# Altium schematic symbol library Altium_Lib.SchLib: 403 symbols (part 2 of 4) (continued)
## Inductor__CDRH6D38-6R2NC (continued)
FIXED IND 6.2UH 2.5A 27 MOHM SMD; Manufacturer: Sumida; Core Material: Ferrite; Tolerance: 30%; Shielding: Shielded; DC Resistance (DCR): 27mR; Test Frequency: 100kHz; Supplier 1: Avnet; Manufacturer Part Number: CDRH6D38NP-6R2NC; Stock 1: 0; Pricing 1: 1000=0.3494, 2000=0.349, 4000=0.3484, 6000=0.3477, 8000=0.3475, 10000=0.347, 100000=0.3466 (USD); Mount: Surface Mount; Case/Package: Nonstandard; Weight: 0.021164oz; Min Operating Temperature: -40°C; Max Operating Temperature: 100°C; Packaging: Tape and Reel; Current Rating: 2.5A; Inductance: 6.2uH; Max DC Current: 2.5A; Termination: SMD/SMT; Series: CDRH; Rated Current-Max: 2.5A; Package Quantity: 1000; DC Current: 2.5A; Length: 7mm; Width: 7mm; Height: 4mm; Height - Seated (Max): 0.157inch; Depth: 7mm; Lead Free: Lead Free; Military Standard: Not; RoHS Compliant: Yes; ComponentLink1URL: http://products.sumida.com/products/pdf/CDRH6D38.pdf?src-supplier=Digi-Key; ComponentLink1Description: http://products.sumida.com/products/pdf/CDRH6D38.pdf?src-supplier=Digi-Key; Supplier Part Number 1: CDRH6D38NP-6R2NC
footprint Inductor__6.7mmX6.7mm (6.7x6.7mm)
pins: 1, 2

## Inductor__LQG18HH33NJ00D
designator L?, comment LQG18HH33NJ00D  Inductance: 33nH
FIXED IND 33NH 300MA 600 MOHM; Manufacturer: Murata; Tolerance: 5%; DC Resistance (DCR): 600mR; Self Resonant Frequency: 1.2GHz; Q Factor: 12; Test Frequency: 100MHz; Supplier 1: Digi-Key; Manufacturer Part Number: LQG18HH33NJ00D; Stock 1: 3104; Pricing 1: 1=0.28, 10=0.253, 100=0.1736, 500=0.1484, 1000=0.1137 (USD); Case/Package: 0603; Min Operating Temperature: -55°C; Max Operating Temperature: 125°C; Packaging: Tape and Reel; Package Quantity: 4000; Max DC Current: 300mA; Termination: SMD/SMT; Length: 1.6mm; Height: 0.8mm; Width: 0.8mm; ComponentLink1URL: http://www.mouser.com/ds/2/281/o05e-522697.pdf?src-supplier=Mouser; ComponentLink1Description: http://www.mouser.com/ds/2/281/o05e-522697.pdf?src-supplier=Mouser; Supplier Part Number 1: 490-14837-1-ND
footprint L-0603 (Chip Inductor; Body 1.6 x 0.8 mm (LxW typ))
pins: 1, 2

## Inductor__LQG18HN18NJ00D
designator L?, comment LQG18HN18NJ00D  Inductance: 18nH
FIXED IND 18NH 350MA 450 MOHM; Manufacturer: Murata; Core Material: Air; Tolerance: 5%; DC Resistance (DCR): 450mR; Self Resonant Frequency: 2.6GHz; Q Factor: 12; Shielding: Unshielded; Test Frequency: 100MHz; Supplier 1: Digi-Key; Manufacturer Part Number: LQG18HN18NJ00D; Stock 1: 17703; Pricing 1: 1=0.21, 10=0.193, 100=0.1287, 500=0.1073, 1000=0.0901 (USD); Mount: Surface Mount; Case/Package: 0603; Number of Pins: 2; Case Code (Metric): 1608; Case Code (Imperial): 0603; Min Operating Temperature: -55°C; Max Operating Temperature: 85°C; Packaging: Tape and Reel; Current Rating: 350mA; Max DC Current: 350mA; Package Quantity: 4000; Inductance Tolerance: 5%; Termination: SMD/SMT; DC Current: 350mA; Military Standard: Not; Length: 1.75mm; Height: 0.8mm; Width: 0.8mm; Height - Seated (Max): 0.037inch; Depth: 0.95mm; Radiation Hardening: No; REACH SVHC: No SVHC; Lead Free: Lead Free; ComponentLink1URL: http://psearch.en.murata.com/inductor/product/LQG18HN18NJ00_.pdf?src-supplier=Digi-Key; ComponentLink1Description: http://psearch.en.murata.com/inductor/product/LQG18HN18NJ00_.pdf?src-supplier=Digi-Key; ComponentLink2URL: http://search.murata.co.jp/Ceramy/image/img/PDF/ENG/L0075S0083LQG18H.pdf?src-supplier=Avnet; ComponentLink2Description: http://search.murata.co.jp/Ceramy/image/img/PDF/ENG/L0075S0083LQG18H.pdf?src-supplier=Avnet; ComponentLink3URL: http://www.farnell.com/datasheets/5102.pdf?src-supplier=Element14; ComponentLink3Description: http://www.farnell.com/datasheets/5102.pdf?src-supplier=Element14; ComponentLink4URL: http://search.murata.co.jp/Ceramy/image/img/P02/JELF243B-0002.pdf?src-supplier=Digi-Key; ComponentLink4Description: http://search.murata.co.jp/Ceramy/image/img/P02/JELF243B-0002.pdf?src-supplier=Digi-Key; ComponentLink5URL: http://search.murata.co.jp/Ceramy/image/img/PDF/ENG/L0075S0083LQG18H.pdf?src-supplier=Avnet+Europe; ComponentLink5Description: http://search.murata.co.jp/Ceramy/image/img/PDF/ENG/L0075S0083LQG18H.pdf?src-supplier=Avnet+Europe; ComponentLink6URL: http://uk.rs-online.com/webdocs/0f10/0900766b80f1087c.pdf?src-supplier=RSComponents; ComponentLink6Description: http://uk.rs-online.com/webdocs/0f10/0900766b80f1087c.pdf?src-supplier=RSComponents; Supplier Part Number 1: 490-6577-1-ND
footprint L-0603 (Chip Inductor; Body 1.6 x 0.8 mm (LxW typ))
pins: 1, 2

## Inductor__MSS6132-104ML
designator L?, comment MSS6132-104ML
COILCRAFT IND 100UH 540MA 620 MOHM; Manufacturer Part Number: MSS6132-104ML; Manufacturer: Coilcraft; ComponentLink1Description: http://www.coilcraft.com/pdfs/mss6132.pdf
footprint Inductor_Coilcraft_MSS6132 (6X6MM)
pins: 1, 2

## Inductor__NRS5014T2R2NMGG
designator L?, comment NRS5014T2R2NMGG
Inductor Power Shielded Wirewound 2.2uH 30% 100KHz Ferrite 2A 0.078Ohm DCR T/R; Manufacturer: Taiyo Yuden; Saturation Current: 2.8A; Self Resonant Frequency: 56MHz; DC Resistance (DCR): 78mR; Supplier 1: Digi-Key; Manufacturer Part Number: NRS5014T2R2NMGG; RoHS: Yes; Category: Fixed Inductors; Stock 1: 589; Pricing 1: 1=0,45000, 10=0,39600, 25=0,34640, 50=0,29700, 100=0,27220, 250=0,24752, 500=0,23264 (USD); Mount: Surface Mount; Case/Package: 5014; Core Material: Ferrite; Min Operating Temperature: -25°C; Max Operating Temperature: 125°C; Package Quantity: 1000; Current Rating: 2A; Tolerance: 30%; Shielding: Shielded; Packaging: Tape and Reel; Inductance: 2.2uH; Resistor Type: Wirewound; Test Frequency: 100kHz; Max DC Current: 2.8A; Termination: SMD/SMT; Inductance Tolerance: 30%; RMS Current (Irms): 2A; Series: NRS; Length: 4.9mm; Width: 0.197inch; Height: 1.4mm; Height - Seated (Max): 0.055inch; Depth: 5.1mm; Radiation Hardening: No; Halogen Free: Halogen Free; REACH SVHC: Unknown; Lead Free: Lead Free; RoHS Compliant: Yes; ComponentLink1URL: https://datasheet.ciiva.com/1043/nrs5014t2r2nmgg-ss-1043827.pdf?src-supplier=Digi-Key; ComponentLink1Description: Datasheet; Supplier Part Number 1: 587-2613-1-ND
footprint INDUCTOR_5MMX5MM
pins: 1, 2

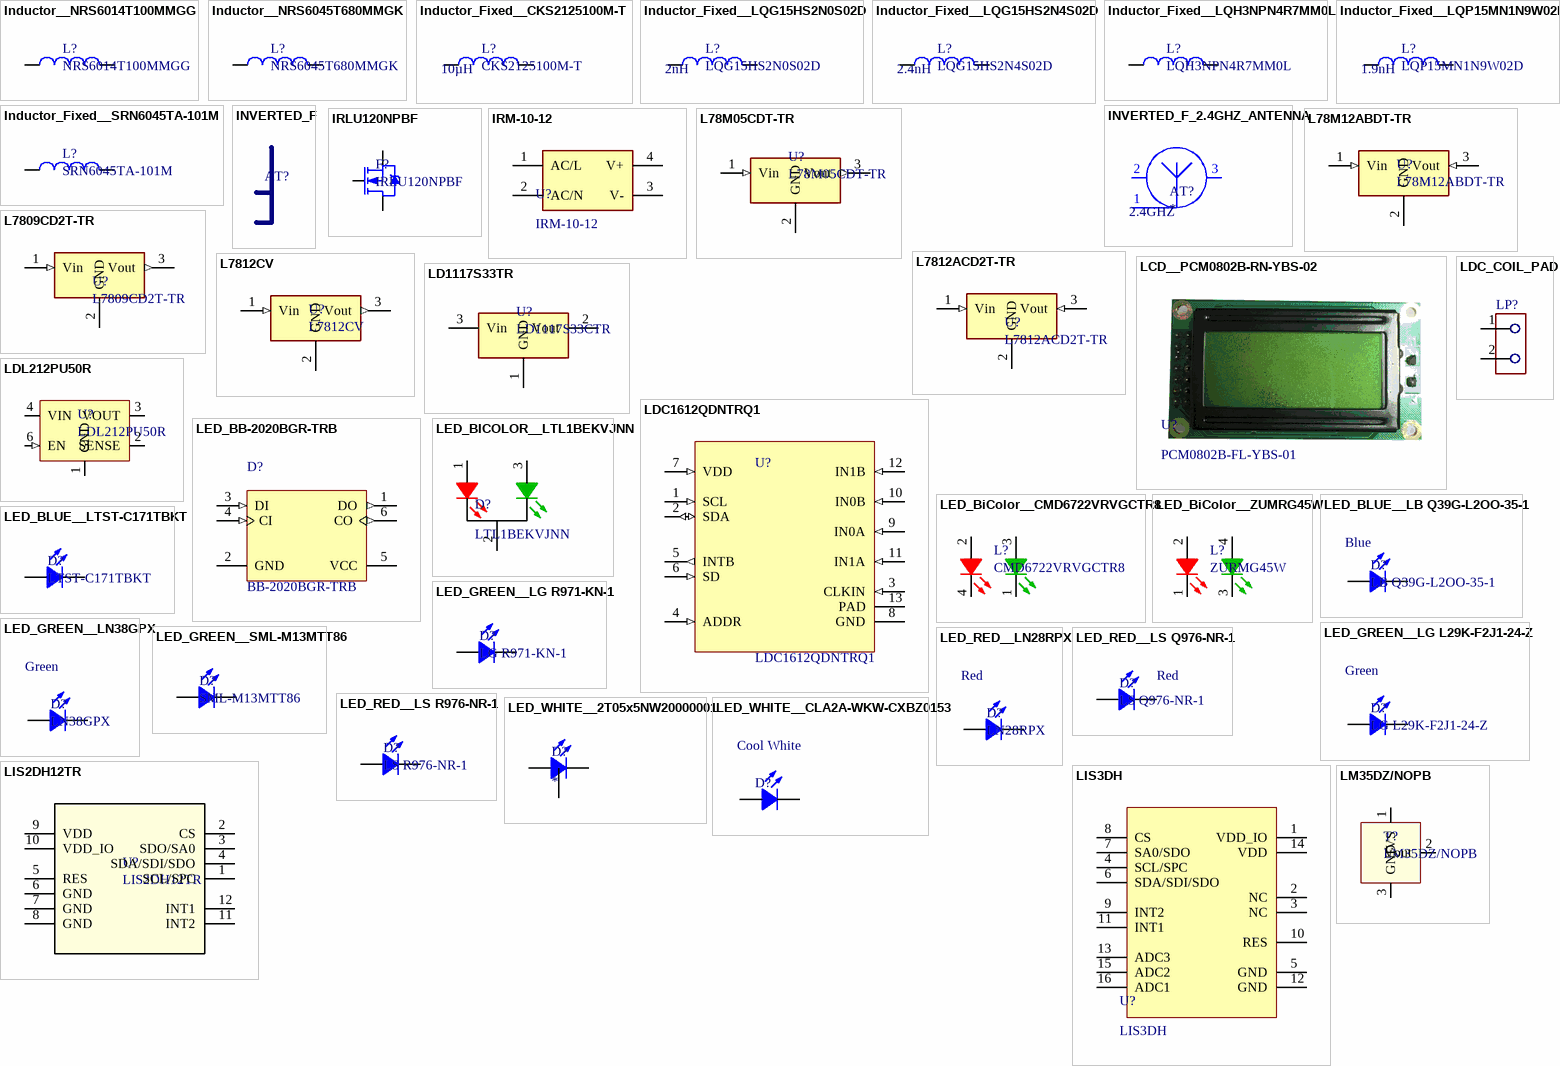
[diagram p5: symbols Inductor__NRS6014T100MMGG to LM35DZ/NOPB]

## Inductor__NRS6014T100MMGG
designator L?, comment NRS6014T100MMGG
INDUCTOR SMD POWER, 10 UH20 %, T; Manufacturer: Taiyo Yuden; Type: Wirewound; Material - Core: Ferrite; Shielding: Shielded; DC Resistance (DCR): 168 mOhm Max; Current - Saturation: 1.4A; Frequency - Self Resonant: 24MHz; Tolerance: ±20%; Features: -; Operating Temperature: -25°C ~ 125°C; Supplier: Digi-Key; Manufacturer Part Number: NRS6014T100MMGG; Height - Seated (Max): 0.055" (1.40mm); Packaging: Cut Tape (CT); RoHS: RoHS Compliant; Q @ Freq: -; Supplier Device Package: -; Ratings: -; Part Status: Active; Category: Inductors, Coils, Chokes; Mounting Type: Surface Mount; Size / Dimension: 0.236" L x 0.236" W (6.00mm x 6.00mm); Package / Case: Nonstandard; ComponentLink1URL: https://www.yuden.co.jp/productdata/catalog/wound04_e.pdf; ComponentLink1Description: https://www.yuden.co.jp/productdata/catalog/wound04_e.pdf; Pricing: 1=0.4, 10=0.354, 100=0.2527, 500=0.21228 (USD); Supplier Part Number: 587-5805-1-ND
footprint Inductor__6mmX6mm (6x6mm)
pins: 1, 2

## Inductor__NRS6045T680MMGK
designator L?, comment NRS6045T680MMGK
FIXED IND 68UH 950MA 395.2 MOHM; Manufacturer: Taiyo Yuden; Material - Core: Ferrite; Current - Saturation: 1.1A; DC Resistance (DCR): 395.2 mOhm Max; Tolerance: ±20%; Frequency - Self Resonant: 4MHz; Type: Wirewound; Shielding: Shielded; Mounting Type: Surface Mount; Manufacturer Part Number: NRS6045T680MMGK; Ratings: -; Packaging: Cut Tape (CT); Part Status: Active; Category: Inductors, Coils, Chokes; Height - Seated (Max): 0.177" (4.50mm); Q @ Freq: -; Supplier: Digi-Key; Supplier Device Package: -; Operating Temperature: -25°C ~ 125°C; Package / Case: Nonstandard; RoHS: RoHS Compliant; Size / Dimension: 0.236" L x 0.236" W (6.00mm x 6.00mm); ComponentLink1URL: http://ds.yuden.co.jp/TYCOMPAS/ut/detail.do?productNo=NRS6045T680MMGK&fileName=NRS6045T680MMGK_SS&mode=specSheetDownload; ComponentLink1Description: http://ds.yuden.co.jp/TYCOMPAS/ut/detail.do?productNo=NRS6045T680MMGK&fileName=NRS6045T680MMGK_SS&mode=specSheetDownload; Pricing: 1=0.43, 10=0.381, 100=0.2622, 500=0.22404 (USD); Stock: 4497; Supplier Part Number: 587-2958-1-ND
footprint Inductor__6mmX6mm (6x6mm)
pins: 1, 2

## Inductor_Fixed__CKS2125100M-T
designator L?, comment CKS2125100M-T  Inductance: 10µH
FIXED IND 10UH 110MA 520 MOHM; Manufacturer: Taiyo Yuden; Shielding: Unshielded; Tolerance: ±20%; Material - Core: Ferrite; DC Resistance (DCR): 520 mOhm Max; Type: Multilayer; Supplier Device Package: 0805 (2012 Metric); Supplier: Digi-Key; Height - Seated (Max): 0.057" (1.45mm); Ratings: -; RoHS: RoHS Compliant; Q @ Freq: -; Packaging: Tape & Reel (TR); Part Status: Active; Mounting Type: Surface Mount; Operating Temperature: -40°C ~ 85°C; Package / Case: 0805 (2012 Metric); Category: Inductors, Coils, Chokes; Size / Dimension: 0.079" L x 0.049" W (2.00mm x 1.25mm); Manufacturer Part Number: CKS2125100M-T; Pricing: 2000=0.063, 4000=0.054, 6000=0.051, 10000=0.048, 50000=0.045, 100000=0.0435 (USD); Supplier Part Number: 587-2608-2-ND
footprint L-0805 (Chip Inductor; Body 2.0 x 1.3 mm (LxW typ))
pins: 1, 2

## Inductor_Fixed__LQG15HS2N0S02D
designator L?, comment LQG15HS2N0S02D  Inductance: 2nH
FIXED IND 2NH 900MA 100 MOHM SMD; Manufacturer: Murata Electronics North America; DC Resistance (DCR): 100 mOhm Max; Shielding: Unshielded; Tolerance: ±0.3nH; Q @ Freq: 8 @ 100MHz; Material - Core: Air; Type: Multilayer; Supplier Device Package: 0402 (1005 Metric); Size / Dimension: 0.039" L x 0.020" W (1.00mm x 0.50mm); Supplier: Digi-Key; Package / Case: 0402 (1005 Metric); Manufacturer Part Number: LQG15HS2N0S02D; Height - Seated (Max): 0.022" (0.55mm); Ratings: -; Part Status: Active; Operating Temperature: -55°C ~ 125°C; Category: Inductors, Coils, Chokes; Mounting Type: Surface Mount; Packaging: Tape & Reel (TR); RoHS: RoHS Compliant; ComponentLink1URL: http://search.murata.co.jp/Ceramy/image/img/P02/JELF243B-0010.pdf; ComponentLink1Description: http://search.murata.co.jp/Ceramy/image/img/P02/JELF243B-0010.pdf; Pricing: 10000=0.01744, 30000=0.0169, 50000=0.01635, 100000=0.01581 (USD); Supplier Part Number: 490-6569-2-ND
footprint L-0402 (Chip Inductor; Body 1.6 x 0.8 mm (LxW typ))
pins: 1, 2

## Inductor_Fixed__LQG15HS2N4S02D
designator L?, comment LQG15HS2N4S02D  Inductance: 2.4nH
FIXED IND 2.4NH 850MA 150 MOHM; Manufacturer: Murata Electronics North America; Q @ Freq: 8 @ 100MHz; Tolerance: ±0.3nH; DC Resistance (DCR): 150 mOhm Max; Shielding: Unshielded; Material - Core: Air; Type: Multilayer; Height - Seated (Max): 0.022" (0.55mm); Supplier Device Package: 0402 (1005 Metric); RoHS: RoHS Compliant; Packaging: Tape & Reel (TR); Supplier: Digi-Key; Size / Dimension: 0.039" L x 0.020" W (1.00mm x 0.50mm); Ratings: -; Manufacturer Part Number: LQG15HS2N4S02D; Category: Inductors, Coils, Chokes; Operating Temperature: -55°C ~ 125°C; Mounting Type: Surface Mount; Package / Case: 0402 (1005 Metric); Part Status: Active; ComponentLink1URL: http://search.murata.co.jp/Ceramy/image/img/P02/JELF243B-0010.pdf; ComponentLink1Description: http://search.murata.co.jp/Ceramy/image/img/P02/JELF243B-0010.pdf; Pricing: 10000=0.01872, 30000=0.01814, 50000=0.01755, 100000=0.01697 (USD); Supplier Part Number: 490-8389-2-ND
footprint L-0402 (Chip Inductor; Body 1.6 x 0.8 mm (LxW typ))
pins: 1, 2

## Inductor_Fixed__LQH3NPN4R7MM0L
designator L?, comment LQH3NPN4R7MM0L
FIXED IND 4.7UH 1.25A 130 MOHM; Manufacturer: Murata Electronics North America; Shielding: Shielded; DC Resistance (DCR): 156 mOhm Max; Type: Wirewound; Material - Core: Ferrite; Tolerance: ±20%; Operating Temperature: -40°C ~ 85°C; Supplier Device Package: 1212 (3030 Metric); Height - Seated (Max): 0.059" (1.50mm); Packaging: Tape & Reel (TR); Manufacturer Part Number: LQH3NPN4R7MM0L; RoHS: RoHS Compliant; Supplier: Digi-Key; Part Status: Last Time Buy; Ratings: -; Q @ Freq: -; Package / Case: 1212 (3030 Metric); Mounting Type: Surface Mount; Category: Inductors, Coils, Chokes; Size / Dimension: 0.118" L x 0.118" W (3.00mm x 3.00mm); ComponentLink1URL: http://psearch.en.murata.com/inductor/product/LQH3NPN4R7MM0#.pdf; ComponentLink1Description: http://psearch.en.murata.com/inductor/product/LQH3NPN4R7MM0#.pdf; Pricing: 0=0 (USD); Supplier Part Number: 490-6642-2-ND
footprint L-1212 (3030)
pins: 1, 2

## Inductor_Fixed__LQP15MN1N9W02D
designator L?, comment LQP15MN1N9W02D  Inductance: 1.9nH
FIXED IND 1.9NH 220MA 300 MOHM; Manufacturer: Murata Electronics North America; Type: Thin Film; Tolerance: ±0.05nH; Shielding: Unshielded; DC Resistance (DCR): 300 mOhm Max; Q @ Freq: 13 @ 500MHz; Supplier Device Package: 0402 (1005 Metric); Package / Case: 0402 (1005 Metric); Category: Inductors, Coils, Chokes; Manufacturer Part Number: LQP15MN1N9W02D; Size / Dimension: 0.039" L x 0.020" W (1.00mm x 0.50mm); Part Status: Active; RoHS: RoHS Compliant; Mounting Type: Surface Mount; Supplier: Digi-Key; Ratings: -; Material - Core: -; Packaging: Tape & Reel (TR); Operating Temperature: -40°C ~ 85°C; Height - Seated (Max): 0.018" (0.45mm); ComponentLink1URL: http://search.murata.co.jp/Ceramy/image/img/P02/JELF243C-0007.pdf; ComponentLink1Description: http://search.murata.co.jp/Ceramy/image/img/P02/JELF243C-0007.pdf; Pricing: 10000=0.06096, 30000=0.05906, 50000=0.05715, 100000=0.05525 (USD); Supplier Part Number: 490-11739-2-ND
footprint L-0402 (Chip Inductor; Body 1.6 x 0.8 mm (LxW typ))
pins: 1, 2

## Inductor_Fixed__SRN6045TA-101M
designator L?, comment SRN6045TA-101M
Inductor Power Semi-Shielded Wirewound 100uH 20% 1MHz 15Q-Factor Ferrite 0.92A 0.456Ohm DCR 2424 Automotive T/R; Manufacturer: Bourns; RMS Current (Irms): 920mA; Saturation Current: 1.33A; DC Resistance (DCR): 456mR; Supplier 1: Avnet; Manufacturer Part Number: SRN6045TA-101M; Stock 1: 0; Pricing 1: 2000=0.2146, 4000=0.2087, 6000=0.2029, 10000=0.197, 20000=0.194, 100000=0.1911, 200000=0.1882 (USD); Mount: Surface Mount; Inductance: 100uH; Packaging: Cut Tape; Inductance Tolerance: 20%; REACH SVHC: No SVHC; RoHS Compliant: Yes; ComponentLink1URL: http://www.farnell.com/datasheets/2163191.pdf?src-supplier=Farnell; ComponentLink1Description: http://www.farnell.com/datasheets/2163191.pdf?src-supplier=Farnell; ComponentLink2URL: http://www.farnell.com/datasheets/2163191.pdf?src-supplier=Element14; ComponentLink2Description: http://www.farnell.com/datasheets/2163191.pdf?src-supplier=Element14; ComponentLink3URL: http://www.farnell.com/datasheets/2163191.pdf?src-supplier=Newark; ComponentLink3Description: http://www.farnell.com/datasheets/2163191.pdf?src-supplier=Newark; ComponentLink4URL: https://www.bourns.com/docs/Product-Datasheets/SRN6045TA.pdf?src-supplier=Digi-Key; ComponentLink4Description: https://www.bourns.com/docs/Product-Datasheets/SRN6045TA.pdf?src-supplier=Digi-Key; Supplier Part Number 1: SRN6045TA-101M
footprint Inductor_74404064470 (6x6mm)
pins: 1, 2

## INVERTED_F
designator AT?
ANT_INV_F_2.4_GHZ_FS_19.5MM_MIR
footprint ANT_INV_F_2.4_GHZ_FS_19.5MM_MIR (F-ANTENNA INVERSE 19.5 mm)
pins: 1, 2

## INVERTED_F_2.4GHZ_ANTENNA
designator AT?  Frequency: 2.4GHZ
ANT_INV_F_2.4_GHZ; Manufacturer Part Number: *; Manufacturer: *
footprint ANT_INV_F_2.4_GHZ
pins: 1, 2, 3

## IRLU120NPBF
designator F?
MOSFET N-CH 100V 10A I-PAK; Manufacturer: Infineon Technologies; Vgs (Max): ±16V; Rds On (Max) @ Id, Vgs: 185 mOhm @ 6A, 10V; Input Capacitance (Ciss) (Max) @ Vds: 440pF @ 25V; Gate Charge (Qg) (Max) @ Vgs: 20nC @ 5V; Drive Voltage (Max Rds On,  Min Rds On): 4V, 10V; Current - Continuous Drain (Id) @ 25°C: 10A (Tc); FET Type: N-Channel; Power Dissipation (Max): 48W (Tc); Vgs(th) (Max) @ Id: 2V @ 250µA; RoHS: RoHS Compliant; Part Status: Active; Category: Discrete Semiconductor Products; FET Feature: -; Supplier: Digi-Key; Packaging: Tube; Technology: MOSFET (Metal Oxide); Supplier Device Package: IPAK (TO-251); Operating Temperature: -55°C ~ 175°C (TJ); Manufacturer Part Number: IRLU120NPBF; Mounting Type: Through Hole; Package / Case: TO-251-3 Short Leads, IPak, TO-251AA; ComponentLink1URL: http://www.infineon.com/dgdl/irlr120npbf.pdf?fileId=5546d462533600a40153566965182665; ComponentLink1Description: http://www.infineon.com/dgdl/irlr120npbf.pdf?fileId=5546d462533600a40153566965182665; Pricing: 1=0.82, 10=0.719, 100=0.551, 500=0.4356, 1000=0.34848 (USD); Supplier Part Number: IRLU120NPBF-ND
footprint TO-251AA
pins: 1 G, 2 D, 3 S

## IRM-10-12
designator U?
AC/DC CONVERTER 12V 10W; Manufacturer: Mean Well USA; Supplier 1: Allied; Manufacturer Part Number: IRM-10-12; RoHS: No; Stock 1: 16; Pricing 1: 1=9.1200, 10=8.4000, 25=7.8900 (USD); ComponentLink1URL: https://www.alliedelec.com/m/d/7b07569e5c01e438749c4ff5eabea1f3.pdf; ComponentLink1Description: https://www.alliedelec.com/m/d/7b07569e5c01e438749c4ff5eabea1f3.pdf; ComponentLink2URL: https://www.alliedelec.com/meanwellusa-irm-10-12/70387819/; ComponentLink2Description: https://www.alliedelec.com/meanwellusa-irm-10-12/70387819/; Supplier Part Number 1: 70387819
footprint IRM-10-12
pins: 1 AC/L, 2 AC/N, 3 V-, 4 V+

## L78M05CDT-TR
designator U?
IC REG LDO 5V 0.5A DPAK; Manufacturer: STMicroelectronics; PSRR: 62dB (120Hz); Output Type: Fixed; Voltage - Input (Max): 35V; Current - Supply: 6mA; Protection Features: Over Current, Over Temperature, Short Circuit; Output Configuration: Positive; Current - Output: 500mA; Part Status: Active; Voltage - Output (Max): -; Voltage Dropout (Max): -; RoHS: RoHS Compliant; Voltage - Output (Min/Fixed): 5V; Supplier: Digi-Key; Category: Integrated Circuits (ICs); Supplier Device Package: D-Pak; Manufacturer Part Number: L78M05CDT-TR; Operating Temperature: 0°C ~ 150°C; Package / Case: TO-252-3, DPak (2 Leads + Tab), SC-63; Packaging: Tape & Reel (TR); Mounting Type: Surface Mount; Control Features: -; ComponentLink1URL: http://www.st.com/content/ccc/resource/technical/document/datasheet/d7/5f/dc/5c/d5/b6/48/7c/CD00000447.pdf/files/CD00000447.pdf/jcr:content/translations/en.CD00000447.pdf; ComponentLink1Description: http://www.st.com/content/ccc/resource/technical/document/datasheet/d7/5f/dc/5c/d5/b6/48/7c/CD00000447.pdf/files/CD00000447.pdf/jcr:content/translations/en.CD00000447.pdf; Supplier Part Number: 497-1203-2-ND
footprint TO-252-3
pins: 1 Vin (in), 2 GND, 3 Vout (out)

## L78M12ABDT-TR
designator U?
IC REG LINEAR 12V 500MA DPAK; Manufacturer: STMicroelectronics; Output Type: Fixed; PSRR: 55dB (120Hz); Voltage - Input (Max): 35V; Output Configuration: Positive; Protection Features: Over Current, Over Temperature, Short Circuit; Supplier: Digi-Key; Category: Integrated Circuits (ICs); RoHS: RoHS Compliant; Current - Output: 500mA; Manufacturer Part Number: L78M12ABDT-TR; Mounting Type: Surface Mount; Packaging: Tape & Reel (TR); Control Features: -; Voltage Dropout (Max): -; Package / Case: TO-252-3, DPak (2 Leads + Tab), SC-63; Supplier Device Package: D-Pak; Part Status: Active; Voltage - Output (Max): -; Voltage - Output (Min/Fixed): 12V; Operating Temperature: -40°C ~ 125°C; ComponentLink1URL: http://media.digikey.com/pdf/Data%20Sheets/ST%20Microelectronics%20PDFS/L78MxxAB,AC%20.pdf; ComponentLink1Description: http://media.digikey.com/pdf/Data%20Sheets/ST%20Microelectronics%20PDFS/L78MxxAB,AC%20.pdf; Pricing: 2500=0.21895, 5000=0.20385, 12500=0.1963, 25000=0.18875 (USD); Supplier Part Number: 497-1209-2-ND
footprint TO-252-3
pins: 1 Vin (in), 2 GND, 3 Vout (in)

## L7809CD2T-TR
designator U?
IC REG LINEAR 9V 1.5A D2PAK; Manufacturer: STMicroelectronics; Voltage Dropout (Max): 2V @ 1A (Typ); Protection Features: Over Temperature, Short Circuit; PSRR: 55dB (120Hz); Output Configuration: Positive; Voltage - Input (Max): 35V; Output Type: Fixed; Supplier Device Package: D2PAK; Package / Case: TO-263-3, D²Pak (2 Leads + Tab), TO-263AB; Mounting Type: Surface Mount; Operating Temperature: 0°C ~ 125°C; Control Features: -; Packaging: Tape & Reel (TR); Current - Output: 1.5A; Voltage - Output (Max): -; Voltage - Output (Min/Fixed): 9V; RoHS: RoHS Compliant; Part Status: Active; Manufacturer Part Number: L7809CD2T-TR; Supplier: Digi-Key; Category: Integrated Circuits (ICs); ComponentLink1URL: http://www.st.com/content/ccc/resource/technical/document/datasheet/41/4f/b3/b0/12/d4/47/88/CD00000444.pdf/files/CD00000444.pdf/jcr:content/translations/en.CD00000444.pdf; ComponentLink1Description: http://www.st.com/content/ccc/resource/technical/document/datasheet/41/4f/b3/b0/12/d4/47/88/CD00000444.pdf/files/CD00000444.pdf/jcr:content/translations/en.CD00000444.pdf; Pricing: 1000=0.32, 2000=0.29, 5000=0.27, 10000=0.26, 25000=0.25 (USD); Supplier Part Number: 497-1176-2-ND
footprint D2PAK
pins: 1 Vin (in), 2 GND, 3 Vout (out)

## L7812ACD2T-TR
designator U?
IC REG LINEAR 12V 1.5A D2PAK; Manufacturer: STMicroelectronics; Protection Features: Over Temperature, Short Circuit; Output Type: Fixed; PSRR: 60dB (120Hz); Voltage Dropout (Max): 2V @ 1A (Typ); Output Configuration: Positive; Voltage - Input (Max): 35V; Mounting Type: Surface Mount; Control Features: -; Package / Case: TO-263-3, D²Pak (2 Leads + Tab), TO-263AB; Supplier Device Package: D2PAK; Packaging: Tape & Reel (TR); Voltage - Output (Max): -; Base Part Number: L7812A; Voltage - Output (Min/Fixed): 12V; Part Status: Active; RoHS: RoHS Compliant; Supplier: Digi-Key; Category: Integrated Circuits (ICs); Manufacturer Part Number: L7812ACD2T-TR; Current - Output: 1.5A; Operating Temperature: 0°C ~ 125°C; ComponentLink1URL: http://www.st.com/content/ccc/resource/technical/document/datasheet/41/4f/b3/b0/12/d4/47/88/CD00000444.pdf/files/CD00000444.pdf/jcr:content/translations/en.CD00000444.pdf; ComponentLink1Description: http://www.st.com/content/ccc/resource/technical/document/datasheet/41/4f/b3/b0/12/d4/47/88/CD00000444.pdf/files/CD00000444.pdf/jcr:content/translations/en.CD00000444.pdf; Pricing: 1000=0.3456, 2000=0.3132, 5000=0.2916, 10000=0.2808, 25000=0.27 (USD); Supplier Part Number: 497-1177-2-ND
footprint D2PAK
pins: 1 Vin (in), 2 GND, 3 Vout (in)

## L7812CV
designator U?
IC REG LINEAR 12V 1.5A TO220AB; Manufacturer: STMicroelectronics; Output Configuration: Positive; PSRR: 55dB (120Hz); Protection Features: Over Temperature, Short Circuit; Voltage Dropout (Max): 2V @ 1A (Typ); Output Type: Fixed; Voltage - Input (Max): 35V; Supplier: Digi-Key; Part Status: Active; Packaging: Tube; Manufacturer Part Number: L7812CV; Category: Integrated Circuits (ICs); RoHS: RoHS Compliant; Current - Output: 1.5A; Control Features: -; Package / Case: TO-220-3; Supplier Device Package: TO-220AB; Mounting Type: Through Hole; Operating Temperature: 0°C ~ 125°C; Voltage - Output (Max): -; Voltage - Output (Min/Fixed): 12V; ComponentLink1URL: http://www.st.com/content/ccc/resource/technical/document/datasheet/41/4f/b3/b0/12/d4/47/88/CD00000444.pdf/files/CD00000444.pdf/jcr:content/translations/en.CD00000444.pdf; ComponentLink1Description: http://www.st.com/content/ccc/resource/technical/document/datasheet/41/4f/b3/b0/12/d4/47/88/CD00000444.pdf/files/CD00000444.pdf/jcr:content/translations/en.CD00000444.pdf; Pricing: 1=0.48, 10=0.413, 100=0.308, 500=0.242, 1000=0.187 (USD); Supplier Part Number: 497-1452-5-ND
footprint TO-220
pins: 1 Vin (in), 2 GND, 3 Vout (out)

## LCD__PCM0802B-RN-YBS-02
designator U?, comment PCM0802B-FL-YBS-01
LCD MOD 8*2 58X32X13,5MM BL XIAMEN PRECISE; Manufacturer Part Number: PCM0802B-FL-YBS-01; Manufacturer: XIAMEN PRECISE
footprint PCM0802B-RN-YBS-02

## LD1117S33TR
designator U?, comment LD1117S33CTR
STMICROELECTRONICS - LD1117S33CTR - IC, V REG, LDO 3.3V, SMD; No. of Outputs: 1; Input Voltage Max: 15; Output Type: Fixed; Voltage Regulator Type: 3-Terminal Fixed Positive<!--FANDB--><div class="features-and-benefits-container"><div class="features-and-benefits-description"><span class="features-benefits-value">The LD1117S33CTR is a low drop voltage regulator able to provide up to 800mA of output current, available even in adjustable version (VREF = 1.25V). The LD1117S33CTR offers an output voltage of 3.3V. The LD1117S33CTR optimises the thermal characteristics even offering a relevant space saving effect. High efficiency is assured by NPN pass transistor. In fact in this case, the quiescent current flows mostly into the load. Only a very common 10?F minimum capacitor is needed for stability. On chip trimming allows the regulator to reach a very tight output voltage tolerance, within ± 1 % at 25; Output Voltage Nom.: 3.3; Output Current Max: 0.8; Product Range: 3.3V 950; Input Voltage Min: 5.3; Dropout Voltage Vdo: 1.1; Output Current: 950; Accuracy %: 1%; Base Number: 1117; SVHC: No SVHC (17-Dec-2015); LDO Regulator Case Style: SOT-223; No. of Pins: 4; Operating Temperature Min: -40; Operating Temperature Max: 125; Packaging: Cut Tape; Operating Temperature Range: -40°C to +125; Termination Type: Surface Mount Device; Adjustable Output Voltage Min: -; Manufacturer: STMICROELECTRONICS; Supply Voltage Max: 15; Fixed Output Voltage Nom.: 3.3; RoHS: YES; Primary Input Voltage: 5.3; Supplier: Farnell; Manufacturer Part Number: LD1117S33CTR; MSL: MSL 1 - Unlimited; Adjustable Output Voltage Max: -; Automotive Qualification Standard: -; ComponentLink1URL: http://www.farnell.com/datasheets/1776449.pdf; ComponentLink1Description: http://www.farnell.com/datasheets/1776449.pdf; ComponentLink2URL: http://www.farnell.com/cad/1724369.zip; ComponentLink2Description: http://www.farnell.com/cad/1724369.zip; ComponentLink3URL: http://www.farnell.com/datasheets/2158622.pdf; ComponentLink3Description: http://www.farnell.com/datasheets/2158622.pdf; Pricing: 5=0.282, 50=0.157, 250=0.152, 500=0.145, 1000=0.127 (GBP); Supplier Part Number: 1467779
footprint SOT223-3N (SOT223/SC73, 4-Leads, Body 6.5x3.5mm, Pitch 2.3mm, Lead Span 7mm, IPC Medium Density)
pins: 1 GND, 2 Vout, 3 Vin

## LDC1612QDNTRQ1
designator U?
2-CHANNEL, 28-BIT INDUCTANCE-TO-; Manufacturer: Texas Instruments; Voltage Supply Source: Single Supply; Resolution (Bits): 28 b; Voltage - Supply: 2.7 V ~ 3.6 V; Data Interface: I²C; Sampling Rate (Per Second): 4.08k; Type: Inductance-to-Digital Converter; Supplier Device Package: 12-WSON (4x4); Package / Case: 12-WFDFN Exposed Pad; Part Status: Active; Category: Integrated Circuits (ICs); Packaging: Tape & Reel (TR); Mounting Type: Surface Mount; Operating Temperature: -40°C ~ 125°C; Supplier: Digi-Key; RoHS: RoHS Compliant; ComponentLink1URL: http://www.ti.com/lit/ds/symlink/ldc1612-q1.pdf; ComponentLink1Description: http://www.ti.com/lit/ds/symlink/ldc1612-q1.pdf; Pricing: 4500=1.54969 (GBP); Supplier Part Number: 296-44528-2-ND; Manufacturer Part Number: LDC1612QDNTRQ1
footprint WSON-12
pins: 1 SCL (in), 2 SDA (io), 3 CLKIN (in), 4 ADDR (in), 5 INTB (out), 6 SD (in), 7 VDD (in), 8 GND, 9 IN0A (in), 10 IN0B (in), 11 IN1A (in), 12 IN1B (in), 13 PAD

## LDC_COIL_PAD
designator LP?  (value not drawn)  (no BOM)
LDC Coil pad; Manufacturer Part Number: *; Manufacturer: *
footprint Coil_pcb_base 3x1.65mm
pins: 1, 2

## LDL212PU50R
designator U?
IC REG LINEAR 1.2A 6DFN; Manufacturer: STMicroelectronics; Output Configuration: Positive; Output Type: Fixed; Voltage - Input (Max): 18V; Voltage - Output (Min/Fixed): 5V; Voltage Dropout (Max): 0.6V @ 1.2A; PSRR: 87dB ~ 50dB (120Hz ~ 100kHz); Control Features: Enable; Protection Features: Over Current, Over Temperature, Under Voltage Lockout (UVLO); Manufacturer Part Number: LDL212PU50R; Category: Integrated Circuits (ICs); Supplier: Digi-Key; RoHS: RoHS Compliant; Packaging: Tape & Reel (TR); Part Status: Active; Voltage - Output (Max): -; Current - Output: 1.2A; Operating Temperature: -40°C ~ 125°C (TJ); Mounting Type: Surface Mount; Package / Case: 6-VDFN Exposed Pad; Supplier Device Package: 6-DFN (3x3); ComponentLink1URL: http://www.st.com/content/ccc/resource/technical/document/datasheet/group3/df/64/f9/b7/91/6e/43/20/DM00225720/files/DM00225720.pdf/jcr:content/translations/en.DM00225720.pdf; ComponentLink1Description: http://www.st.com/content/ccc/resource/technical/document/datasheet/group3/df/64/f9/b7/91/6e/43/20/DM00225720/files/DM00225720.pdf/jcr:content/translations/en.DM00225720.pdf; Pricing: 3000=0.18135, 6000=0.16965, 15000=0.15795, 30000=0.14976 (USD); Supplier Part Number: 497-16897-2-ND
footprint DFN_6__(3mmX3mm)
pins: 0 TERMAL hidden to GND, 1 GND (power), 2 SENSE, 3 VOUT (power), 4 VIN (power), 6 EN (in)

## LED_BB-2020BGR-TRB
designator D?, comment BB-2020BGR-TRB
Addressable Lighting BL-2020RGB 1 LED Discrete Serial Red, Green, Blue (RGB) 2.00mm L x 2.00mm W; Manufacturer: American Bright; MF: American Bright Optoelectronics Corporation; Availability: Bad; MP: BB-2020BGR-TRB; Package: None; Check_prices: https://www.snapeda.com/parts/BB-2020BGR-TRB/American%20Bright%20Optoelectronics/view-part/5657571/?ref=eda; Value: *; Price: None; Supplier 1: Digi-Key; Manufacturer Part Number: BB-2020BGR-TRB; RoHS: No; Stock 1: 15269; Pricing 1: 1=1,05000, 10=0,66200, 100=0,49020, 500=0,45050, 1000=0,37500 (USD); Supplier Part Number 1: 2007-BB-2020BGR-TRBDKR-ND; ComponentLink1Description: Datasheet; ComponentLink1URL: https://www.americanbrightled.com/pdffiles/led-components/plcc/BB-2020BGR-TRB.pdf
footprint LED_BB-2020BGR-TRB
footprint LED_BB-2020BGR-TRB(LPKF)
pins: 1 DO (out), 2 GND (power), 3 DI (in), 4 CI (in), 5 VCC (power), 6 CO (out)

## LED_BiColor__CMD6722VRVGCTR8
designator L?, comment CMD6722VRVGCTR8
LED GREEN/RED CLEAR SMD; Manufacturer: VCC CHML; Color: Green,Red; Forward Current: 20mA; Viewing Angle: 120°; Forward Voltage: 2.8V; Lens Style: Clear,Round,Flat,Diffused; Number of Elements: 2; Power Dissipation: 100mW; Wavelength: 570nm; Reverse Voltage: 5V; Luminous Intensity: 10mcd; Voltage: 2V; Lens Size: 2.4mm; Supplier 1: Future Electronics; Manufacturer Part Number: CMD6722VRVGCTR8; Stock 1: 0; Pricing 1: 2000=0.43 (USD); Mount: Surface Mount; Case/Package: PLCC; Number of Pins: 4; Lens Color: Clear; Min Operating Temperature: -40°C; Max Operating Temperature: 85°C; Packaging: Tape and Reel; Test Current: 20mA; Package Quantity: 2000; Illumination Color: Green,Red; Power Rating: 100mW; Reverse Voltage (DC): 5V; Lens Transparency: Clear; Series: CMD67-22; Length: 3.2mm; Width: 2.8mm; Height: 2.1mm; Depth: 3.2mm; REACH SVHC: Unknown; Lead Free: Lead Free; RoHS Compliant: Yes; ComponentLink1URL: http://www1.futureelectronics.com/doc/CML%20INNOVATIVE%20TECHNOLOGIES/CMD67-22VRVGC__TR8.pdf?src-supplier=Future+Electronics; ComponentLink1Description: http://www1.futureelectronics.com/doc/CML%20INNOVATIVE%20TECHNOLOGIES/CMD67-22VRVGC__TR8.pdf?src-supplier=Future+Electronics; ComponentLink2URL: http://static.vcclite.com/pdf/CMD67-22%20SERIES%20SMT%20LEDs.pdf?src-supplier=Digi-Key; ComponentLink2Description: http://static.vcclite.com/pdf/CMD67-22%20SERIES%20SMT%20LEDs.pdf?src-supplier=Digi-Key; Supplier Part Number 1: 1638337
footprint LED_3228_BiColor
pins: 1 K, 2 A, 3 A, 4 K

## LED_BICOLOR__LTL1BEKVJNN
designator D?, comment LTL1BEKVJNN
LED GREEN/RED DIFFUSED T/H; Manufacturer: Lite-On; Configuration: Common Cathode; Illumination Color: Red, Green; LED Size: T-1 (3 mm); Lens Shape: Dome; Luminous Intensity: 110 mcd; Viewing Angle: 45 deg; If - Forward Current: 20 mA; Operating Supply Voltage: 2 V, 2.1 V; Wavelength/Color Temperature: 639 nm, 575 nm; Supplier 1: Mouser; Manufacturer Part Number: LTL1BEKVJNN; RoHS: RoHS Compliant; Category: Standard LEDs - Through Hole; Stock 1: 27767; Pricing 1: 1=0.380, 10=0.220, 100=0.145, 1000=0.100, 2500=0.084, 10000=0.078, 25000=0.075, 50000=0.073, 100000=0.070 (USD); Package / Case: T-1 (3 mm); Packaging: Bulk; Product: Bi-Color LEDs; Brand: Lite-On; Mounting Style: Through Hole; Lens Dimensions: 3 mm; Lens Transparency: Diffused; Maximum Operating Temperature: + 100 C; Minimum Operating Temperature: - 40 C; Product Type: LED - Standard; Standard Pack Qty: 1000; Subcategory: LEDs; RoHS - Mouser: Y; Minimum Order Quantity: 1; Reeling: False; ComponentLink1URL: https://www.mouser.com/datasheet/2/239/LTL1BEKVJNN-1142081.pdf; ComponentLink1Description: https://www.mouser.com/datasheet/2/239/LTL1BEKVJNN-1142081.pdf; Supplier Part Number 1: 859-LTL1BEKVJNN
footprint LED_BICOLOR_3mm
pins: 1 R, 2 K, 3 G

## LED_BiColor__ZUMRG45W
designator L?, comment ZURMG45W
Bi color Led (Red,Green); Manufacturer: SUN LED; Manufacturer Part Number: ZURMG45W; ComponentLink1Description: https://www.digchip.com/datasheets/parts/datasheet/463/ZURMG45W-pdf.php; Mounting Type: Surface Mount
footprint LED_3528_BiColor
pins: 1 K, 2 A, 3 K, 4 A

## LED_BLUE__LB Q39G-L2OO-35-1
designator D?, comment LB Q39G-L2OO-35-1  Color: Blue
LED BLUE DIFFUSED 0603 SMD; Manufacturer: OSRAM Opto Semiconductors Inc.; Viewing Angle: 170°, 130°; Wavelength - Peak: 472nm; Current - Test: 5mA; Millicandela Rating: 29.5mcd; Lens Style/Size: Rectangle with Flat Top, 1.10mm x 0.80mm; Lens Color: White; Voltage - Forward (Vf) (Typ): 2.85V; Wavelength - Dominant: 470nm; Packaging: Cut Tape (CT); Package / Case: 0603 (1608 Metric); Supplier Device Package: 0603; Manufacturer Part Number: LB Q39G-L2OO-35-1; Part Status: Active; Supplier: Digi-Key; Lens Transparency: Diffused; Category: Optoelectronics; Size / Dimension: 1.60mm L x 0.80mm W; Mounting Type: Surface Mount; RoHS: RoHS Compliant; Height (Max): 0.40mm; Features: -; ComponentLink1URL: https://media.digikey.com/pdf/Data%20Sheets/Osram%20PDFs/LB_LT%20Q39G.pdf; ComponentLink1Description: https://media.digikey.com/pdf/Data%20Sheets/Osram%20PDFs/LB_LT%20Q39G.pdf; Pricing: 1=0.45, 10=0.319, 25=0.2768, 100=0.213, 250=0.17304, 500=0.12778, 1000=0.10648 (USD); Supplier Part Number: 475-2816-1-ND
footprint DIODE_0603_Blue (Chip Resistor; Body 1.6 x 0.8 mm (LxW typ))
pins: 1 A, 2 K

## LED_BLUE__LTST-C171TBKT
designator D?, comment LTST-C171TBKT